# Altium footprint library Zynq-Video-Board.PcbLib: 39 footprints (part 2 of 3)
Each footprint in its own frame and in the unit in brackets; x right, y up, seen from the top. Pads: shape width x height; smd on the part's side, far side on the other; paste and mask are expansions set on the pad; w line width, h text height; cw(c..) or ccw(c..) is an arc to the next point about the centre after c.
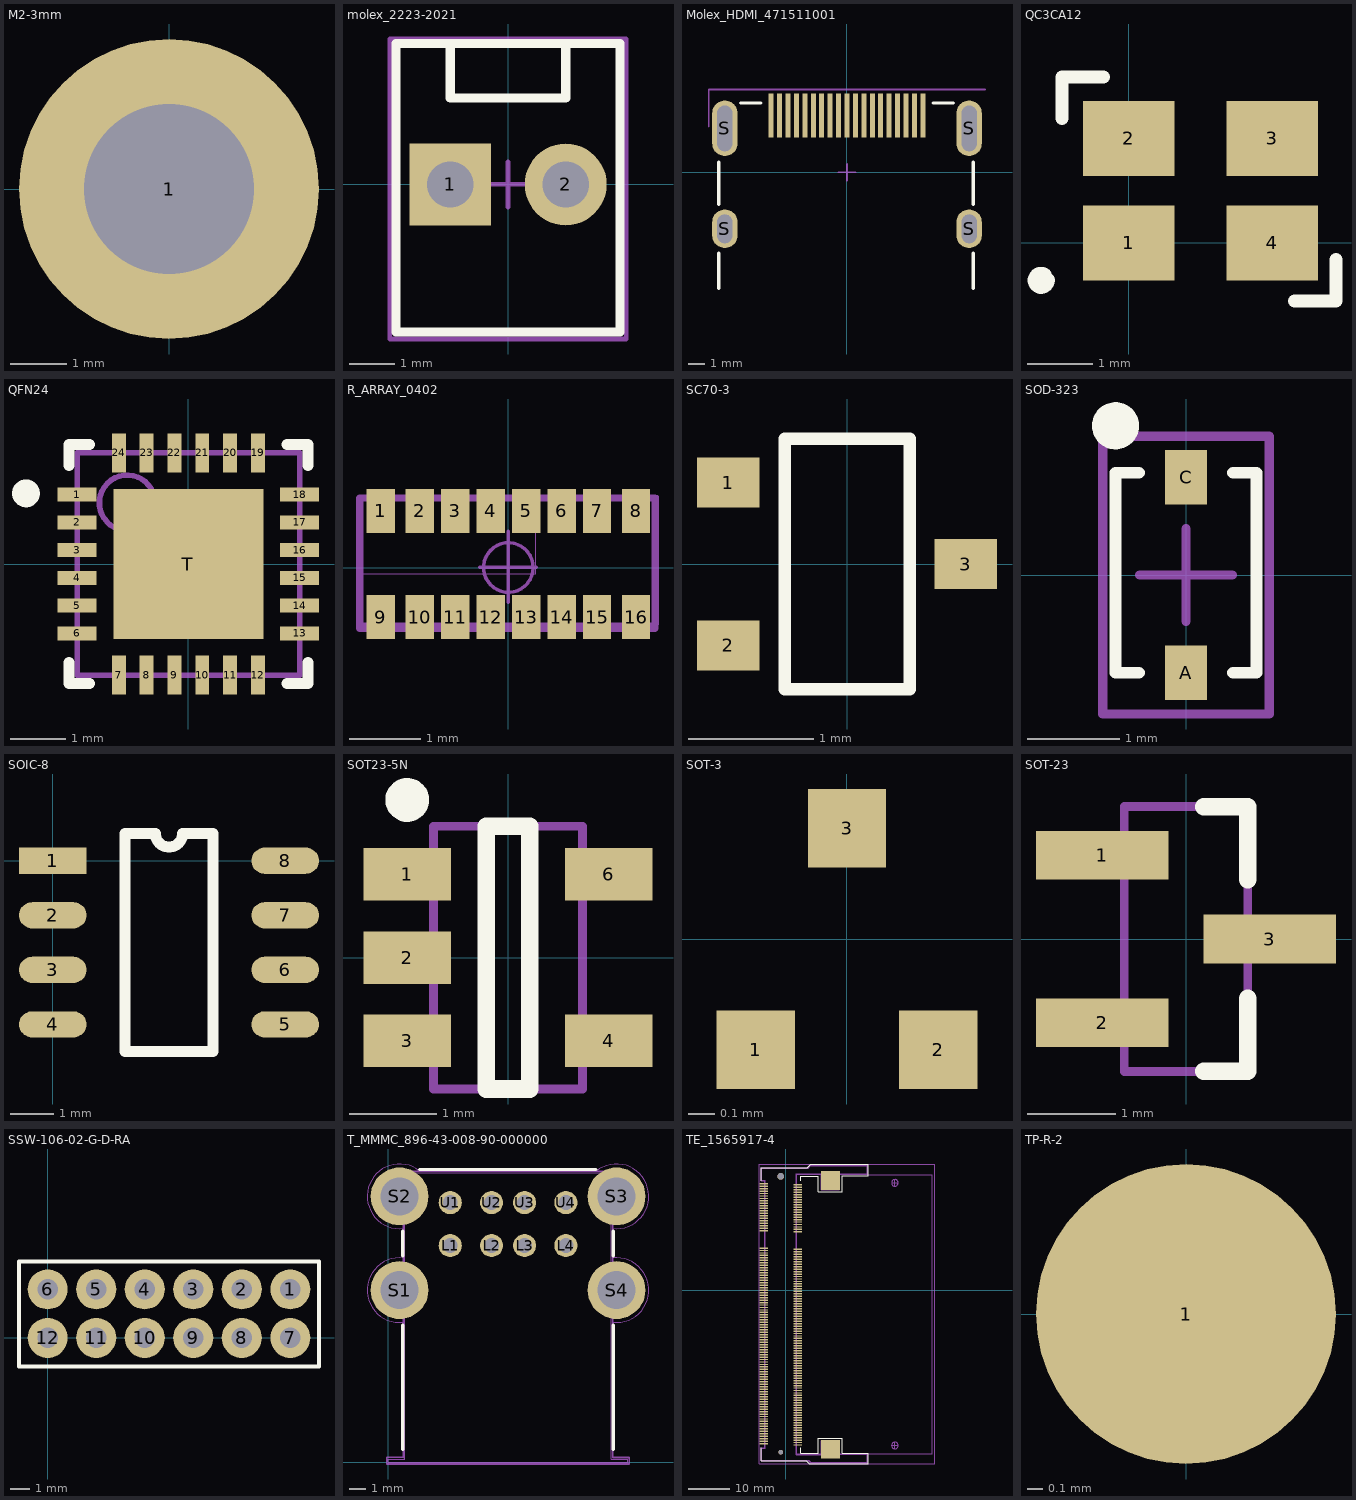
[diagram p1: the footprints below, top view; thin cyan lines are the x and y axes]

## M2-3mm [mm]
pads (1):
  round 5.3 / inner round 0 / far side round 0 hole 3 paste-403.566: 1(0,0)
Top Paste:
  drawing of 4 lines, arcs and shapes, not listed
Mechanical 13:
  circle w0.12: c0,0 r2.175
3D body: height 3, standoff -1.4, extent -2.175,-2.171 2.158,2.171

## molex_2223-2021 [mm]
pads (2):
  rect 1.8x1.8 hole 1.02: 1(-1.27,0)
  round 1.8 hole 1.02: 2(1.27,0)
Top Overlay:
  lines w0.2: -1.27,3.1 -1.27,1.905 1.27,1.905 1.27,3.1 ; -2.465,-3.25 -2.465,3.1 2.465,3.1 2.465,-3.25 -2.465,-3.25
Mechanical 13:
  lines w0.1: -1.27,3.1 -1.27,1.905 1.27,1.905 1.27,3.1 ; -2.465,-3.25 -2.465,3.1 2.465,3.1 2.465,-3.25 -2.465,-3.25
Mechanical 15:
  lines w0.1: -0.5,0 0.5,0 ; 0,-0.5 0,0.5 ; -2.6,-3.4 2.6,-3.4 2.6,3.2 -2.6,3.2 -2.6,-3.4
3D body: height 10.68, standoff -3.54, extent -2.489,-3.2 2.439,3.15

## Molex_HDMI_471511001 [mm]
pads (23):
  rect 0.3x2.6 smd: 1(4.5,3.36) 2(4,3.36) 3(3.5,3.36) 4(3,3.36) 5(2.5,3.36) 6(2,3.36) 7(1.5,3.36) 8(1,3.36) 9(0.5,3.36) 10(0,3.36) 11(-0.5,3.36) 12(-1,3.36) 13(-1.5,3.36) 14(-2,3.36) 15(-2.5,3.36) 16(-3,3.36) 17(-3.5,3.36) 18(-4,3.36) 19(-4.5,3.36)
  oval 1.5x2.3 hole 0.9 slot 1.7 at 90 deg: S(-7.25,-3.36) S(7.25,-3.36)
  oval 1.5x3.3 hole 0.9 slot 2.7 at 90 deg: S(-7.25,2.6) S(7.25,2.6)
Top Overlay:
  lines w0.2: -7.6,-6.9 -7.6,-4.8 ; -7.6,-1.9 -7.6,0.6 ; -6.3,4.1 -5.1,4.1 ; 5.1,4.1 6.3,4.1 ; 7.5,-6.9 7.5,-4.8 ; 7.5,-1.9 7.5,0.6
Mechanical 15:
  lines w0.1: -8.2,2.7 -8.2,4.9 8.2,4.9 ; -0.5,0 0.5,0 ; 0,-0.5 0,0.5
3D body: height 6.28, standoff -2.1, extent -7.55,-8.075 7.45,4.075

## QC3CA12 [mm]
pads (4):
  rect 1.4x1.15 smd: 1(0,0) 2(0,1.6) 3(2.2,1.6) 4(2.2,0)
Top Overlay:
  lines w0.2: -1.016,1.905 -1.016,2.54 -0.381,2.54 ; 2.54,-0.889 3.175,-0.889 3.175,-0.254
  lines w0.254: -1.3,-0.5 ccw(c-1.336,-0.572) -1.256,-0.572
3D body: height 0.8, standoff 0, extent -0.507,-0.538 2.793,2.062

## QFN24 [mm]
pads (25):
  rect 0.7x0.25 smd: 1(-2,1.25) 2(-2,0.75) 3(-2,0.25) 4(-2,-0.25) 5(-2,-0.75) 6(-2,-1.25) 13(2,-1.25) 14(2,-0.75) 15(2,-0.25) 16(2,0.25) 17(2,0.75) 18(2,1.25)
  rect 0.25x0.7 smd: 7(-1.25,-2) 8(-0.75,-2) 9(-0.25,-2) 10(0.25,-2) 11(0.75,-2) 12(1.25,-2) 19(1.25,2) 20(0.75,2) 21(0.25,2) 22(-0.25,2) 23(-0.75,2) 24(-1.25,2)
  rect 2.7x2.7 smd: T(0,0)
Top Overlay:
  circle w0.25: c-2.921,1.27 r0.125
  lines w0.2: -2.15,-1.775 -2.15,-2.15 -1.775,-2.15 ; -2.15,1.775 -2.15,2.15 -1.775,2.15 ; 1.775,-2.15 2.15,-2.15 2.15,-1.775 ; 1.775,2.15 2.15,2.15 2.15,1.775
Mechanical 13:
  circle w0.1: c-1.1,1.1 r0.5
  lines w0.1: -2,-2 -2,2 2,2 2,-2 -2,-2
Mechanical 15:
  lines w0.1: -0.5,0 0.5,0 ; 0,-0.5 0,0.5
3D body: height 0.9, standoff 0, extent -2.002,-2.002 2.002,2.002

## R_ARRAY_0402 [mm]
pads (16):
  rect 0.4x0.62 smd: 1(-1.8,0.8) 2(-1.25,0.8) 3(-0.75,0.8) 4(-0.25,0.8) 5(0.25,0.8) 6(0.75,0.8) 7(1.25,0.8) 8(1.8,0.8) 9(-1.8,-0.7) 10(-1.25,-0.7) 11(-0.75,-0.7) 12(-0.25,-0.7) 13(0.25,-0.7) 14(0.75,-0.7) 15(1.25,-0.7) 16(1.8,-0.7)
Mechanical 1:
  circle w0.05: c0,0 r0.35
  lines w0.05: -0.407,0.006 0.393,0.006 ; 0,-0.49 0,0.51 ; -2.1,-0.8 2.1,-0.8 2.1,1 -2.1,1 -2.1,-0.8
Mechanical 2:
  lines w0.001: -2.122,-0.089 0.385,-0.089 0.385,1.005 -2.122,1.005 -2.122,-0.089
Mechanical 3:
  lines w0.1: -2.097,-0.86 2.07,-0.86 2.07,0.98 -2.097,0.98 -2.097,-0.86
3D body: height 0.45, standoff 0, extent -2,-0.7 2,0.9

## SC70-3 [mm]
pads (3):
  rect 0.5x0.4 smd: 1(-0.95,0.65) 2(-0.95,-0.65) 3(0.95,0)
Top Overlay:
  lines w0.1: -0.5,-1 -0.5,1 0.5,1 0.5,-1 -0.5,-1
3D body: height 1, standoff 0, extent -1.15,-1.075 1.15,1.025

## SOD-323 [mm]
pads (2):
  rect 0.45x0.59 smd: A(0,-1.055) C(0,1.055)
Top Overlay:
  circle w0.254: c-0.762,1.612 r0.127
  lines w0.127: -0.508,-1.055 -0.762,-1.055 -0.762,1.104 -0.508,1.104 ; 0.508,-1.055 0.762,-1.055 0.762,1.104 0.508,1.104
Mechanical 15:
  lines w0.1: -0.5,0 0.5,0 ; 0,-0.5 0,0.5 ; -0.9,-1.5 0.9,-1.5 0.9,1.5 0,1.5 -0.9,1.5 -0.9,-1.5
3D body: height 1, standoff 0.01, extent -0.625,-1.25 0.625,1.25

## SOIC-8 [mil]
pads (8):
  rect 62x24 smd: 1(0,0)
  oval 62x24 smd: 2(0,-50) 3(0,-100) 4(0,-150) 5(213,-150) 6(213,-100) 7(213,-50) 8(213,0)
Top Overlay:
  lines w10: 66,-175 66,25 94,25 ccw(c106.5,25) 119,25 147,25 147,-175 66,-175
3D body: height 68.7, standoff -0.31, extent -17.03,-173.43 227.04,23.42

## SOT23-5N [mm]
pads (5):
  rect 1x0.6 smd: 1(-1.15,0.95) 2(-1.15,0) 3(-1.15,-0.95) 4(1.15,-0.95) 6(1.15,0.95)
Top Overlay:
  circle w0.25: c-1.15,1.8 r0.125
  lines w0.2: -0.25,-1.5 0.25,-1.5 0.25,1.5 -0.25,1.5 -0.25,-1.5
Mechanical 13:
  lines w0.1: -0.85,-1.5 -0.85,1.5 0.85,1.5 0.85,-1.5 -0.85,-1.5
3D body: height 1.1, standoff 0, extent -1.19,-1.462 1.21,1.438

## SOT-3 [mm]
pads (3):
  rect 0.3x0.3 smd: 1(-0.35,-0.425) 2(0.35,-0.425) 3(0,0.425)
3D body: height 0.51, standoff 0, extent -0.508,-0.381 0.508,0.381

## SOT-23 [mm]
pads (3):
  rect 1.5x0.55 smd: 1(-0.95,0.95) 2(-0.95,-0.95) 3(0.95,0)
Top Overlay:
  lines w0.2: 0.2,-1.5 0.7,-1.5 0.7,-0.675 ; 0.2,1.5 0.7,1.5 0.7,0.675
Mechanical 13:
  lines w0.1: -0.7,-1.5 -0.7,1.5 0.7,1.5 0.7,-1.5 -0.7,-1.5
3D body: height 1.21, standoff -0.01, extent -1.126,-1.5 1.126,1.5

## SSW-106-02-G-D-RA [mm]
pads (12):
  round 2.1 hole 1.067: 1(12.7,2.54) 2(10.16,2.54) 3(7.62,2.54) 4(5.08,2.54) 5(2.54,2.54) 6(0,2.54) 7(12.7,0) 8(10.16,0) 9(7.62,0) 10(5.08,0) 11(2.54,0) 12(0,0)
Top Overlay:
  lines w0.2: -1.5,-1.5 -1.5,4 14.2,4 14.2,-1.5 -1.5,-1.5
3D body: height 5.04, standoff -3.16, extent -1.39,-9.8 14.1,2.8

## T_MMMC_896-43-008-90-000000 [mm]
pads (12):
  round 1.4 hole 0.9: L1(3.75,13.13) L2(6.25,13.13) L3(8.25,13.13) L4(10.75,13.13) U1(3.75,15.73) U2(6.25,15.73) U3(8.25,15.73) U4(10.75,15.73)
  round 3.5 hole 2.3: S1(0.68,10.43) S2(0.68,16.11) S3(13.82,16.11) S4(13.82,10.43)
Top Overlay:
  lines w0.2: 0.875,0.8 0.875,8.3 ; 0.875,12.5 0.875,14 ; 1.91,17.73 12.58,17.73 ; 13.625,0.8 13.625,8.3 ; 13.625,12.5 13.625,14
Mechanical 1:
  lines w0.05: 0.901,8.484 0.901,0.299 -0.099,0.299 -0.099,-0.099 14.599,-0.099 14.599,0.299 13.599,0.299 13.599,8.485 ; 0.901,12.374 0.901,14.164 ; 0.902,8.484 cw(c0.685,10.429) 0.904,12.374 ; 0.903,14.164 cw(c0.679,16.109) 1.895,17.643 1.91,17.628 12.582,17.628 ; 12.582,17.631 cw(c13.815,16.11) 13.598,14.165 ; 13.599,12.375 13.599,14.165 ; 13.599,12.376 cw(c13.815,10.43) 13.6,8.485
Mechanical 2:
  lines w0.001: 0,0 0,0.2 1,0.2 1,17.53 13.5,17.53 13.5,0.2 14.5,0.2 14.5,0 0,0
Mechanical 3:
  lines w0.1: 0.9,0.299 0.9,17.629 13.599,17.629 13.599,0.299 14.6,0.299 14.6,-0.099 -0.099,-0.099 -0.099,0.299 0.901,0.299
3D body: height 16.17, standoff -3.58, extent -0.45,0 14.95,17.53

## TE_1565917-4 [mm]
pads (204):
  rect 2x0.35 smd: 1(-5.349,25.791) 2(2.851,25.491) 3(-5.349,25.191) 4(2.851,24.891) 5(-5.349,24.591) 6(2.851,24.291) 7(-5.349,23.991) 8(2.851,23.691) 9(-5.349,23.391) 10(2.851,23.091) 11(-5.349,22.791) 12(2.851,22.491) 13(-5.349,22.191) 14(2.851,21.891) 15(-5.349,21.591) 16(2.851,21.291) 17(-5.349,20.991) 18(2.851,20.691) 19(-5.349,20.391) 20(2.851,20.091) 21(-5.349,19.791) 22(2.851,19.491) 23(-5.349,19.191) 24(2.851,18.891) 25(-5.349,18.591) 26(2.851,18.291) 27(-5.349,17.991) 28(2.851,17.691) 29(-5.349,17.391) 30(2.851,17.091) 31(-5.349,16.791) 32(2.851,16.491) 33(-5.349,16.191) 34(2.851,15.891) 35(-5.349,15.591) 36(2.851,15.291) 37(-5.349,14.991) 38(2.851,14.691) 39(-5.349,14.391) 40(2.851,14.091) 41(-5.349,10.191) 42(2.851,9.891) 43(-5.349,9.591) 44(2.851,9.291) 45(-5.349,8.991) 46(2.851,8.691) 47(-5.349,8.391) 48(2.851,8.091) 49(-5.349,7.791) 50(2.851,7.491) 51(-5.349,7.191) 52(2.851,6.891) 53(-5.349,6.591) 54(2.851,6.291) 55(-5.349,5.991) 56(2.851,5.691) 57(-5.349,5.391) 58(2.851,5.091) 59(-5.349,4.791) 60(2.851,4.491) 61(-5.349,4.191) 62(2.851,3.891) 63(-5.349,3.591) 64(2.851,3.291) 65(-5.349,2.991) 66(2.851,2.691) 67(-5.349,2.391) 68(2.851,2.091) 69(-5.349,1.791) 70(2.851,1.491) 71(-5.349,1.191) 72(2.851,0.891) 73(-5.349,0.591) 74(2.851,0.291) 75(-5.349,-0.009) 76(2.851,-0.309) 77(-5.349,-0.609) 78(2.851,-0.909) 79(-5.349,-1.209) 80(2.851,-1.509) 81(-5.349,-1.809) 82(2.851,-2.109) 83(-5.349,-2.409) 84(2.851,-2.709) 85(-5.349,-3.009) 86(2.851,-3.309) 87(-5.349,-3.609) 88(2.851,-3.909) 89(-5.349,-4.209) 90(2.851,-4.509) 91(-5.349,-4.809) 92(2.851,-5.109) 93(-5.349,-5.409) 94(2.851,-5.709) 95(-5.349,-6.009) 96(2.851,-6.309) 97(-5.349,-6.609) 98(2.851,-6.909) 99(-5.349,-7.209) 100(2.851,-7.509) 101(-5.349,-7.809) 102(2.851,-8.109) 103(-5.349,-8.409) 104(2.851,-8.709) 105(-5.349,-9.009) 106(2.851,-9.309) 107(-5.349,-9.609) 108(2.851,-9.909) 109(-5.349,-10.209) 110(2.851,-10.509) 111(-5.349,-10.809) 112(2.851,-11.109) 113(-5.349,-11.409) 114(2.851,-11.709) 115(-5.349,-12.009) 116(2.851,-12.309) 117(-5.349,-12.609) 118(2.851,-12.909) 119(-5.349,-13.209) 120(2.851,-13.509) 121(-5.349,-13.809) 122(2.851,-14.109) 123(-5.349,-14.409) 124(2.851,-14.709) 125(-5.349,-15.009) 126(2.851,-15.309) 127(-5.349,-15.609) 128(2.851,-15.909) 129(-5.349,-16.209) 130(2.851,-16.509) 131(-5.349,-16.809) 132(2.851,-17.109) 133(-5.349,-17.409) 134(2.851,-17.709) 135(-5.349,-18.009) 136(2.851,-18.309) 137(-5.349,-18.609) 138(2.851,-18.909) 139(-5.349,-19.209) 140(2.851,-19.509) 141(-5.349,-19.809) 142(2.851,-20.109) 143(-5.349,-20.409) 144(2.851,-20.709) 145(-5.349,-21.009) 146(2.851,-21.309) 147(-5.349,-21.609) 148(2.851,-21.909) 149(-5.349,-22.209) 150(2.851,-22.509) 151(-5.349,-22.809) 152(2.851,-23.109) 153(-5.349,-23.409) 154(2.851,-23.709) 155(-5.349,-24.009) 156(2.851,-24.309) 157(-5.349,-24.609) 158(2.851,-24.909) 159(-5.349,-25.209) 160(2.851,-25.509) 161(-5.349,-25.809) 162(2.851,-26.109) 163(-5.349,-26.409) 164(2.851,-26.709) 165(-5.349,-27.009) 166(2.851,-27.309) 167(-5.349,-27.609) 168(2.851,-27.909) 169(-5.349,-28.209) 170(2.851,-28.509) 171(-5.349,-28.809) 172(2.851,-29.109) 173(-5.349,-29.409) 174(2.851,-29.709) 175(-5.349,-30.009) 176(2.851,-30.309) 177(-5.349,-30.609) 178(2.851,-30.909) 179(-5.349,-31.209) 180(2.851,-31.509) 181(-5.349,-31.809) 182(2.851,-32.109) 183(-5.349,-32.409) 184(2.851,-32.709) 185(-5.349,-33.009) 186(2.851,-33.309) 187(-5.349,-33.609) 188(2.851,-33.909) 189(-5.349,-34.209) 190(2.851,-34.509) 191(-5.349,-34.809) 192(2.851,-35.109) 193(-5.349,-35.409) 194(2.851,-35.709) 195(-5.349,-36.009) 196(2.851,-36.309) 197(-5.349,-36.609) 198(2.851,-36.909) 199(-5.349,-37.209) 200(2.851,-37.509)
  round 1.1 hole 1.1 unplated: ""(-1.249,-39.259)
  round 1.6 hole 1.6 unplated: ""(-1.249,27.541)
  rect 4.6x4.5 smd: ""(10.751,-38.559) ""(10.751,26.541)
Top Overlay:
  lines w0.2: -5.984,-38.171 -5.984,-41.309 1.651,-41.309 ; -5.984,26.506 -5.984,29.672 1.62,29.672 1.621,29.671 5.131,29.671 6.001,30.541 19.924,30.541 19.924,27.641 13.701,27.641 13.701,23.84 7.851,23.84 7.851,27.541 3.551,27.541 3.551,26.506 ; 1.601,-41.309 4.901,-41.309 5.701,-42.109 19.924,-42.109 19.924,-39.559 ; 3.551,-39.509 7.859,-39.509 7.859,-35.85 13.701,-35.85 13.701,-39.559 19.851,-39.559 ; 3.551,-39.491 3.551,-38.171
Mechanical 3:
  lines w0.1: -5.857,-41.184 -5.857,-38.263 -4.968,-38.263 -4.968,26.634 -5.857,26.634 -5.857,29.555 0.62,29.555 5.446,29.555 5.954,30.063 19.67,30.063 19.67,28.158 12.812,28.158 12.812,24.602 8.748,24.602 8.748,28.158 2.525,28.158 2.525,-39.914 8.748,-39.914 8.748,-36.612 12.812,-36.612 12.812,-39.787 19.67,-39.787 19.67,-41.692 6.081,-41.692 5.573,-41.184 0.62,-41.184 -5.857,-41.184
Mechanical 13:
  circle w0.1: c26.4,25.975 r0.802
  circle w0.1: c26.397,25.975 r0.814
  circle w0.1: c26.398,-37.625 r0.802
  lines w0.1: 19.797,27.941 35.451,27.941 35.451,-39.659 19.797,-39.659 ; 25.581,-37.625 27.219,-37.625 ; 25.583,25.975 27.221,25.975 ; 26.397,25.151 26.397,26.789 ; 26.4,-38.387 26.4,-36.863 ; 26.402,25.213 26.402,26.737 ; 26.402,25.975 25.662,25.975 27.202,25.975 ; 19.797,-39.66 12.939,-39.66 12.939,-36.485 8.621,-36.485 8.621,-39.66 2.652,-39.66 2.652,28.031 8.621,28.031 8.621,24.348 12.939,24.348 12.939,28.031 19.797,28.031 19.797,30.19 5.954,30.19 5.446,29.682 0.874,29.682 -5.984,29.682 -5.984,26.507 -5.095,26.507 -5.095,-38.171 -5.984,-38.171 -5.984,-41.311 0.874,-41.311 5.446,-41.311 5.954,-41.819 19.797,-41.819 19.797,-39.66
Mechanical 15:
  lines w0.2: -6.441,-42.103 -6.441,30.541 36.053,30.541 36.053,-42.103 19.873,-42.103 -6.441,-42.103
3D body: height 5.12, standoff 1.27, extent -1.325,-39.454 28.675,27.747
3D body: height 5.66, standoff -0.52, extent -6.281,-41.607 20.274,29.893

## TP-R-2 [mm]
pads (1):
  round 2 smd: 1(0,0)